# Altium footprint library texas.PCBLIB: 124 footprints (part 8 of 12)
Each footprint in its own frame and in the unit in brackets; x right, y up, seen from the top. Pads: shape width x height; smd on the part's side, far side on the other; paste and mask are expansions set on the pad; w line width, h text height; cw(c..) or ccw(c..) is an arc to the next point about the centre after c.
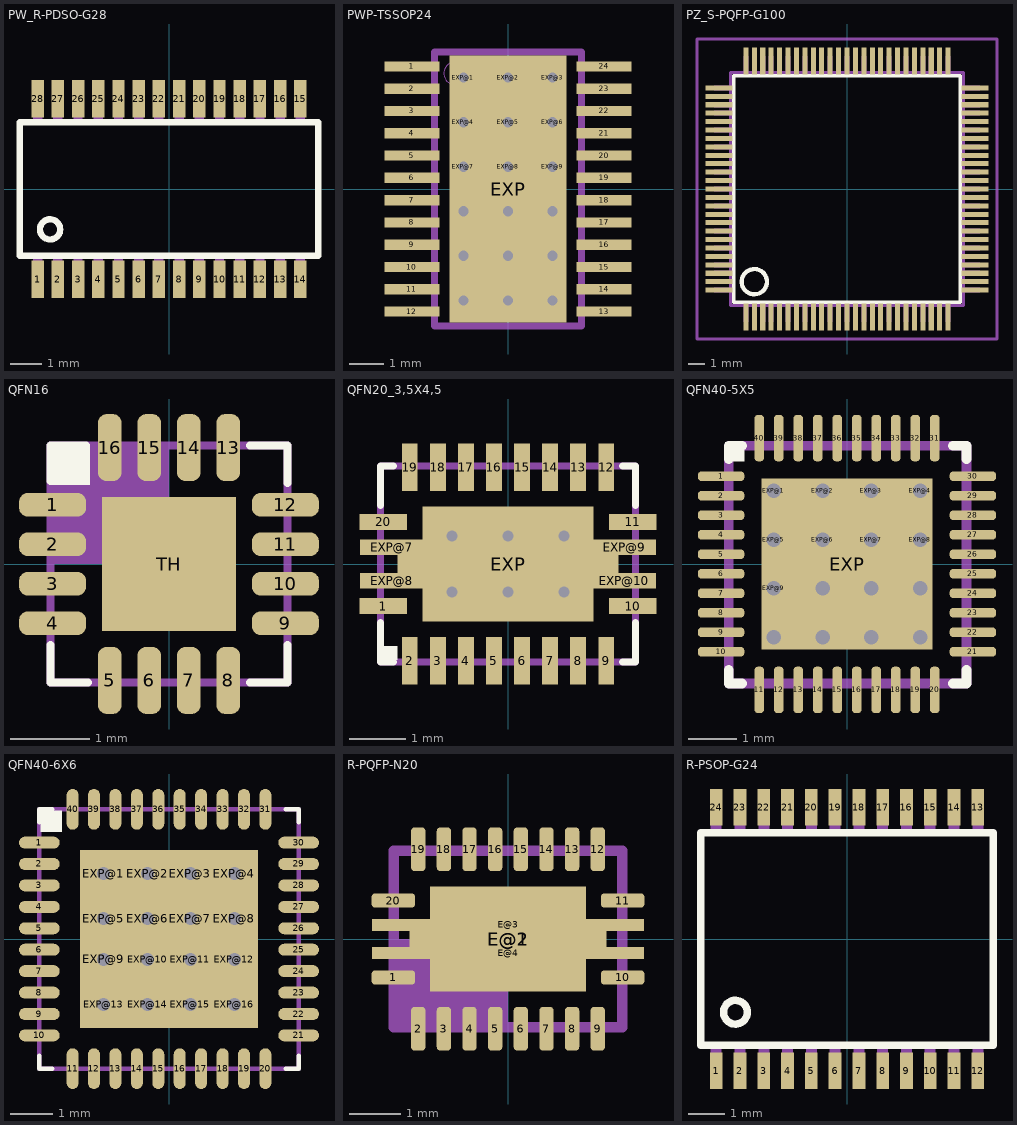
[diagram p7: the footprints below, top view; thin cyan lines are the x and y axes]

## PW_R-PDSO-G28 [mm]
pads (28):
  rect 0.4x1.2 smd: 1(-4.225,-2.9) 2(-3.575,-2.9) 3(-2.925,-2.9) 4(-2.275,-2.9) 5(-1.625,-2.9) 6(-0.975,-2.9) 7(-0.325,-2.9) 8(0.325,-2.9) 9(0.975,-2.9) 10(1.625,-2.9) 11(2.275,-2.9) 12(2.925,-2.9) 13(3.575,-2.9) 14(4.225,-2.9) 15(4.225,2.9) 16(3.575,2.9) 17(2.925,2.9) 18(2.275,2.9) 19(1.625,2.9) 20(0.975,2.9) 21(0.325,2.9) 22(-0.325,2.9) 23(-0.975,2.9) 24(-1.625,2.9) 25(-2.275,2.9) 26(-2.925,2.9) 27(-3.575,2.9) 28(-4.225,2.9)
Top Overlay:
  circle w0.203: c-3.825,-1.3 r0.325
  lines w0.203: -4.8,-2.15 4.8,-2.15 4.8,2.15 -4.8,2.15 -4.8,-2.15
Mechanical 16:
  rectangle: -4.375,-3.3 -4.075,-2.23
  rectangle: -3.725,-3.3 -3.425,-2.23
  rectangle: -3.075,-3.3 -2.775,-2.23
  rectangle: -2.425,-3.3 -2.125,-2.23
  rectangle: -1.775,-3.3 -1.475,-2.23
  rectangle: -1.125,-3.3 -0.825,-2.23
  rectangle: -0.475,-3.3 -0.175,-2.23
  rectangle: 0.175,-3.3 0.475,-2.23
  rectangle: 0.825,-3.3 1.125,-2.23
  rectangle: 1.475,-3.3 1.775,-2.23
  rectangle: 2.125,-3.3 2.425,-2.23
  rectangle: 2.775,-3.3 3.075,-2.23
  rectangle: 3.425,-3.3 3.725,-2.23
  rectangle: 4.075,-3.3 4.375,-2.23
  region: 4.375,3.3 4.075,3.3 4.075,2.23 4.375,2.23
  region: 3.725,3.3 3.425,3.3 3.425,2.23 3.725,2.23
  region: 3.075,3.3 2.775,3.3 2.775,2.23 3.075,2.23
  region: 2.425,3.3 2.125,3.3 2.125,2.23 2.425,2.23
  region: 1.775,3.3 1.475,3.3 1.475,2.23 1.775,2.23
  region: 1.125,3.3 0.825,3.3 0.825,2.23 1.125,2.23
  region: 0.475,3.3 0.175,3.3 0.175,2.23 0.475,2.23
  region: -0.175,3.3 -0.475,3.3 -0.475,2.23 -0.175,2.23
  region: -0.825,3.3 -1.125,3.3 -1.125,2.23 -0.825,2.23
  region: -1.475,3.3 -1.775,3.3 -1.775,2.23 -1.475,2.23
  region: -2.125,3.3 -2.425,3.3 -2.425,2.23 -2.125,2.23
  region: -2.775,3.3 -3.075,3.3 -3.075,2.23 -2.775,2.23
  region: -3.425,3.3 -3.725,3.3 -3.725,2.23 -3.425,2.23
  region: -4.075,3.3 -4.375,3.3 -4.375,2.23 -4.075,2.23

## PWP-TSSOP24 [mm]
pads (43):
  rect 1.6x0.3 smd: 1(-2.8,3.575) 2(-2.8,2.925) 3(-2.8,2.275) 4(-2.8,1.625) 5(-2.8,0.975) 6(-2.8,0.325) 7(-2.8,-0.325) 8(-2.8,-0.975) 9(-2.8,-1.625) 10(-2.8,-2.275) 11(-2.8,-2.925) 12(-2.8,-3.575) 13(2.8,-3.575) 14(2.8,-2.925) 15(2.8,-2.275) 16(2.8,-1.625) 17(2.8,-0.975) 18(2.8,-0.325) 19(2.8,0.325) 20(2.8,0.975) 21(2.8,1.625) 22(2.8,2.275) 23(2.8,2.925) 24(2.8,3.575)
  rect 3.4x7.8 smd: EXP(0,0)
  round 0.7 hole 0.3: EXP@1(-1.3,3.25) EXP@2(0,3.25) EXP@3(1.3,3.25) EXP@4(-1.3,1.95) EXP@5(0,1.95) EXP@6(1.3,1.95) EXP@7(-1.3,0.65) EXP@8(0,0.65) EXP@9(1.3,0.65) EXP@10(-1.3,-0.65) EXP@11(0,-0.65) EXP@12(1.3,-0.65) EXP@13(-1.3,-1.95) EXP@14(0,-1.95) EXP@15(1.3,-1.95) EXP@16(-1.3,-3.25) EXP@17(0,-3.25) EXP@18(1.3,-3.25)
Top Paste:
  rectangle: -3.575,3.45 -2.025,3.7
  rectangle: -3.575,2.8 -2.025,3.05
  rectangle: -3.575,2.15 -2.025,2.4
  rectangle: -3.575,1.5 -2.025,1.75
  rectangle: -3.575,0.85 -2.025,1.1
  rectangle: -3.575,0.2 -2.025,0.45
  rectangle: -3.575,-0.45 -2.025,-0.2
  rectangle: -3.575,-1.1 -2.025,-0.85
  rectangle: -3.575,-1.75 -2.025,-1.5
  rectangle: -3.575,-2.4 -2.025,-2.15
  rectangle: -3.575,-3.05 -2.025,-2.8
  rectangle: -3.575,-3.7 -2.025,-3.45
  region: 3.575,-3.45 2.025,-3.45 2.025,-3.7 3.575,-3.7
  region: 3.575,-2.8 2.025,-2.8 2.025,-3.05 3.575,-3.05
  region: 3.575,-2.15 2.025,-2.15 2.025,-2.4 3.575,-2.4
  region: 3.575,-1.5 2.025,-1.5 2.025,-1.75 3.575,-1.75
  region: 3.575,-0.85 2.025,-0.85 2.025,-1.1 3.575,-1.1
  region: 3.575,-0.2 2.025,-0.2 2.025,-0.45 3.575,-0.45
  region: 3.575,0.45 2.025,0.45 2.025,0.2 3.575,0.2
  region: 3.575,1.1 2.025,1.1 2.025,0.85 3.575,0.85
  region: 3.575,1.75 2.025,1.75 2.025,1.5 3.575,1.5
  region: 3.575,2.4 2.025,2.4 2.025,2.15 3.575,2.15
  region: 3.575,3.05 2.025,3.05 2.025,2.8 3.575,2.8
  region: 3.575,3.7 2.025,3.7 2.025,3.45 3.575,3.45
  rectangle: -1.2,-2.575 1.2,2.575
Top Solder:
  rectangle: -3.65,3.375 -1.95,3.775
  rectangle: -3.65,2.725 -1.95,3.125
  rectangle: -3.65,2.075 -1.95,2.475
  rectangle: -3.65,1.425 -1.95,1.825
  rectangle: -3.65,0.775 -1.95,1.175
  rectangle: -3.65,0.125 -1.95,0.525
  rectangle: -3.65,-0.525 -1.95,-0.125
  rectangle: -3.65,-1.175 -1.95,-0.775
  rectangle: -3.65,-1.825 -1.95,-1.425
  rectangle: -3.65,-2.475 -1.95,-2.075
  rectangle: -3.65,-3.125 -1.95,-2.725
  rectangle: -3.65,-3.775 -1.95,-3.375
  region: 3.65,-3.375 1.95,-3.375 1.95,-3.775 3.65,-3.775
  region: 3.65,-2.725 1.95,-2.725 1.95,-3.125 3.65,-3.125
  region: 3.65,-2.075 1.95,-2.075 1.95,-2.475 3.65,-2.475
  region: 3.65,-1.425 1.95,-1.425 1.95,-1.825 3.65,-1.825
  region: 3.65,-0.775 1.95,-0.775 1.95,-1.175 3.65,-1.175
  region: 3.65,-0.125 1.95,-0.125 1.95,-0.525 3.65,-0.525
  region: 3.65,0.525 1.95,0.525 1.95,0.125 3.65,0.125
  region: 3.65,1.175 1.95,1.175 1.95,0.775 3.65,0.775
  region: 3.65,1.825 1.95,1.825 1.95,1.425 3.65,1.425
  region: 3.65,2.475 1.95,2.475 1.95,2.075 3.65,2.075
  region: 3.65,3.125 1.95,3.125 1.95,2.725 3.65,2.725
  region: 3.65,3.775 1.95,3.775 1.95,3.375 3.65,3.375
  rectangle: -1.7,-3.9 1.7,3.9
Mechanical 16:
  circle w0: c-1.55,3.375 r0.325
  rectangle: -3.2,3.45 -2.2,3.7
  rectangle: -3.2,2.8 -2.2,3.05
  rectangle: -3.2,2.15 -2.2,2.4
  rectangle: -3.2,1.5 -2.2,1.75
  rectangle: -3.2,0.85 -2.2,1.1
  rectangle: -3.2,0.2 -2.2,0.45
  rectangle: -3.2,-0.45 -2.2,-0.2
  rectangle: -3.2,-1.1 -2.2,-0.85
  rectangle: -3.2,-1.75 -2.2,-1.5
  rectangle: -3.2,-2.4 -2.2,-2.15
  rectangle: -3.2,-3.05 -2.2,-2.8
  rectangle: -3.2,-3.7 -2.2,-3.45
  region: 3.2,-3.45 2.2,-3.45 2.2,-3.7 3.2,-3.7
  region: 3.2,-2.8 2.2,-2.8 2.2,-3.05 3.2,-3.05
  region: 3.2,-2.15 2.2,-2.15 2.2,-2.4 3.2,-2.4
  region: 3.2,-1.5 2.2,-1.5 2.2,-1.75 3.2,-1.75
  region: 3.2,-0.85 2.2,-0.85 2.2,-1.1 3.2,-1.1
  region: 3.2,-0.2 2.2,-0.2 2.2,-0.45 3.2,-0.45
  region: 3.2,0.45 2.2,0.45 2.2,0.2 3.2,0.2
  region: 3.2,1.1 2.2,1.1 2.2,0.85 3.2,0.85
  region: 3.2,1.75 2.2,1.75 2.2,1.5 3.2,1.5
  region: 3.2,2.4 2.2,2.4 2.2,2.15 3.2,2.15
  region: 3.2,3.05 2.2,3.05 2.2,2.8 3.2,2.8
  region: 3.2,3.7 2.2,3.7 2.2,3.45 3.2,3.45
  lines w0.203: -2.15,-4 2.15,-4 2.15,4 -2.15,4 -2.15,-4

## PZ_S-PQFP-G100 [mm]
pads (100):
  rect 0.3x1.6 smd: 1(-6,-7.6) 2(-5.5,-7.6) 3(-5,-7.6) 4(-4.5,-7.6) 5(-4,-7.6) 6(-3.5,-7.6) 7(-3,-7.6) 8(-2.5,-7.6) 9(-2,-7.6) 10(-1.5,-7.6) 11(-1,-7.6) 12(-0.5,-7.6) 13(0,-7.6) 14(0.5,-7.6) 15(1,-7.6) 16(1.5,-7.6) 17(2,-7.6) 18(2.5,-7.6) 19(3,-7.6) 20(3.5,-7.6) 21(4,-7.6) 22(4.5,-7.6) 23(5,-7.6) 24(5.5,-7.6) 25(6,-7.6) 51(6,7.6) 52(5.5,7.6) 53(5,7.6) 54(4.5,7.6) 55(4,7.6) 56(3.5,7.6) 57(3,7.6) 58(2.5,7.6) 59(2,7.6) 60(1.5,7.6) 61(1,7.6) 62(0.5,7.6) 63(0,7.6) 64(-0.5,7.6) 65(-1,7.6) 66(-1.5,7.6) 67(-2,7.6) 68(-2.5,7.6) 69(-3,7.6) 70(-3.5,7.6) 71(-4,7.6) 72(-4.5,7.6) 73(-5,7.6) 74(-5.5,7.6) 75(-6,7.6)
  rect 1.6x0.3 smd: 26(7.6,-6) 27(7.6,-5.5) 28(7.6,-5) 29(7.6,-4.5) 30(7.6,-4) 31(7.6,-3.5) 32(7.6,-3) 33(7.6,-2.5) 34(7.6,-2) 35(7.6,-1.5) 36(7.6,-1) 37(7.6,-0.5) 38(7.6,0) 39(7.6,0.5) 40(7.6,1) 41(7.6,1.5) 42(7.6,2) 43(7.6,2.5) 44(7.6,3) 45(7.6,3.5) 46(7.6,4) 47(7.6,4.5) 48(7.6,5) 49(7.6,5.5) 50(7.6,6) 76(-7.6,6) 77(-7.6,5.5) 78(-7.6,5) 79(-7.6,4.5) 80(-7.6,4) 81(-7.6,3.5) 82(-7.6,3) 83(-7.6,2.5) 84(-7.6,2) 85(-7.6,1.5) 86(-7.6,1) 87(-7.6,0.5) 88(-7.6,0) 89(-7.6,-0.5) 90(-7.6,-1) 91(-7.6,-1.5) 92(-7.6,-2) 93(-7.6,-2.5) 94(-7.6,-3) 95(-7.6,-3.5) 96(-7.6,-4) 97(-7.6,-4.5) 98(-7.6,-5) 99(-7.6,-5.5) 100(-7.6,-6)
Top Overlay:
  circle w0.254: c-5.5,-5.5 r0.75
  lines w0.203: -6.72,-6.71 6.71,-6.71 6.71,6.71 -6.72,6.71 -6.72,-6.71
Mechanical 16:
  rectangle: -6.15,-7.9 -5.85,-6.95
  rectangle: -5.65,-7.9 -5.35,-6.95
  rectangle: -5.15,-7.9 -4.85,-6.95
  rectangle: -4.65,-7.9 -4.35,-6.95
  rectangle: -4.15,-7.9 -3.85,-6.95
  rectangle: -3.65,-7.9 -3.35,-6.95
  rectangle: -3.15,-7.9 -2.85,-6.95
  rectangle: -2.65,-7.9 -2.35,-6.95
  rectangle: -2.15,-7.9 -1.85,-6.95
  rectangle: -1.65,-7.9 -1.35,-6.95
  rectangle: -1.15,-7.9 -0.85,-6.95
  rectangle: -0.65,-7.9 -0.35,-6.95
  rectangle: -0.15,-7.9 0.15,-6.95
  rectangle: 0.35,-7.9 0.65,-6.95
  rectangle: 0.85,-7.9 1.15,-6.95
  rectangle: 1.35,-7.9 1.65,-6.95
  rectangle: 1.85,-7.9 2.15,-6.95
  rectangle: 2.35,-7.9 2.65,-6.95
  rectangle: 2.85,-7.9 3.15,-6.95
  rectangle: 3.35,-7.9 3.65,-6.95
  rectangle: 3.85,-7.9 4.15,-6.95
  rectangle: 4.35,-7.9 4.65,-6.95
  rectangle: 4.85,-7.9 5.15,-6.95
  rectangle: 5.35,-7.9 5.65,-6.95
  rectangle: 5.85,-7.9 6.15,-6.95
  rectangle: 6.95,-6.15 7.9,-5.85
  rectangle: 6.95,-5.65 7.9,-5.35
  rectangle: 6.95,-5.15 7.9,-4.85
  rectangle: 6.95,-4.65 7.9,-4.35
  rectangle: 6.95,-4.15 7.9,-3.85
  rectangle: 6.95,-3.65 7.9,-3.35
  rectangle: 6.95,-3.15 7.9,-2.85
  rectangle: 6.95,-2.65 7.9,-2.35
  rectangle: 6.95,-2.15 7.9,-1.85
  rectangle: 6.95,-1.65 7.9,-1.35
  rectangle: 6.95,-1.15 7.9,-0.85
  rectangle: 6.95,-0.65 7.9,-0.35
  rectangle: 6.95,-0.15 7.9,0.15
  rectangle: 6.95,0.35 7.9,0.65
  rectangle: 6.95,0.85 7.9,1.15
  rectangle: 6.95,1.35 7.9,1.65
  rectangle: 6.95,1.85 7.9,2.15
  rectangle: 6.95,2.35 7.9,2.65
  rectangle: 6.95,2.85 7.9,3.15
  rectangle: 6.95,3.35 7.9,3.65
  rectangle: 6.95,3.85 7.9,4.15
  rectangle: 6.95,4.35 7.9,4.65
  rectangle: 6.95,4.85 7.9,5.15
  rectangle: 6.95,5.35 7.9,5.65
  rectangle: 6.95,5.85 7.9,6.15
  rectangle: 5.85,6.95 6.15,7.9
  rectangle: 5.35,6.95 5.65,7.9
  rectangle: 4.85,6.95 5.15,7.9
  rectangle: 4.35,6.95 4.65,7.9
  rectangle: 3.85,6.95 4.15,7.9
  rectangle: 3.35,6.95 3.65,7.9
  rectangle: 2.85,6.95 3.15,7.9
  rectangle: 2.35,6.95 2.65,7.9
  rectangle: 1.85,6.95 2.15,7.9
  rectangle: 1.35,6.95 1.65,7.9
  rectangle: 0.85,6.95 1.15,7.9
  rectangle: 0.35,6.95 0.65,7.9
  rectangle: -0.15,6.95 0.15,7.9
  rectangle: -0.65,6.95 -0.35,7.9
  rectangle: -1.15,6.95 -0.85,7.9
  rectangle: -1.65,6.95 -1.35,7.9
  rectangle: -2.15,6.95 -1.85,7.9
  rectangle: -2.65,6.95 -2.35,7.9
  rectangle: -3.15,6.95 -2.85,7.9
  rectangle: -3.65,6.95 -3.35,7.9
  rectangle: -4.15,6.95 -3.85,7.9
  rectangle: -4.65,6.95 -4.35,7.9
  rectangle: -5.15,6.95 -4.85,7.9
  rectangle: -5.65,6.95 -5.35,7.9
  rectangle: -6.15,6.95 -5.85,7.9
  rectangle: -7.9,5.85 -6.95,6.15
  rectangle: -7.9,5.35 -6.95,5.65
  rectangle: -7.9,4.85 -6.95,5.15
  rectangle: -7.9,4.35 -6.95,4.65
  rectangle: -7.9,3.85 -6.95,4.15
  rectangle: -7.9,3.35 -6.95,3.65
  rectangle: -7.9,2.85 -6.95,3.15
  rectangle: -7.9,2.35 -6.95,2.65
  rectangle: -7.9,1.85 -6.95,2.15
  rectangle: -7.9,1.35 -6.95,1.65
  rectangle: -7.9,0.85 -6.95,1.15
  rectangle: -7.9,0.35 -6.95,0.65
  rectangle: -7.9,-0.15 -6.95,0.15
  rectangle: -7.9,-0.65 -6.95,-0.35
  rectangle: -7.9,-1.15 -6.95,-0.85
  rectangle: -7.9,-1.65 -6.95,-1.35
  rectangle: -7.9,-2.15 -6.95,-1.85
  rectangle: -7.9,-2.65 -6.95,-2.35
  rectangle: -7.9,-3.15 -6.95,-2.85
  rectangle: -7.9,-3.65 -6.95,-3.35
  rectangle: -7.9,-4.15 -6.95,-3.85
  rectangle: -7.9,-4.65 -6.95,-4.35
  rectangle: -7.9,-5.15 -6.95,-4.85
  rectangle: -7.9,-5.65 -6.95,-5.35
  rectangle: -7.9,-6.15 -6.95,-5.85
  lines w0.203: -6.91,-6.91 6.91,-6.91 6.91,6.91 -6.91,6.91 -6.91,-6.91
Mechanical 27:
  lines w0.2: -8.9,-8.9 -8.9,8.9 8.9,8.9 8.9,-8.9 -8.9,-8.9

## QFN16 [mm]
pads (17):
  rrect75% 0.85x0.3 smd: 1(-1.475,0.75) 2(-1.475,0.25) 3(-1.475,-0.25) 4(-1.475,-0.75) 9(1.475,-0.75) 10(1.475,-0.25) 11(1.475,0.25) 12(1.475,0.75)
  rrect75% 0.3x0.85 smd: 5(-0.75,-1.475) 6(-0.25,-1.475) 7(0.25,-1.475) 8(0.75,-1.475) 13(0.75,1.475) 14(0.25,1.475) 15(-0.25,1.475) 16(-0.75,1.475)
  rect 1.7x1.7 smd: TH(0,0)
Top Overlay:
  rectangle: -1.5,1 -1,1.5
  lines w0.102: -1.5,-1.025 -1.5,-1.5 -1.025,-1.5 ; -1.5,1.05 -1.5,1.5 -1.05,1.5 ; 1.025,-1.5 1.5,-1.5 1.5,-1.025 ; 1.025,1.5 1.5,1.5 1.5,1.025
Top Paste:
  circle w0: c-1.2,0.75 r0.125
  circle w0: c-1.2,0.25 r0.125
  circle w0: c-1.2,-0.25 r0.125
  circle w0: c-1.2,-0.75 r0.125
  circle w0: c-0.75,-1.2 r0.125
  circle w0: c-0.25,-1.2 r0.125
  circle w0: c0.25,-1.2 r0.125
  circle w0: c0.75,-1.2 r0.125
  circle w0: c1.2,-0.75 r0.125
  circle w0: c1.2,-0.25 r0.125
  circle w0: c1.2,0.25 r0.125
  circle w0: c1.2,0.75 r0.125
  circle w0: c0.75,1.2 r0.125
  circle w0: c0.25,1.2 r0.125
  circle w0: c-0.25,1.2 r0.125
  circle w0: c-0.75,1.2 r0.125
  region: -0.1,0.1 -0.1,0.8 -0.8,0.8 -0.8,0.1
  rectangle: -1.85,0.625 -1.2,0.875
  rectangle: -1.85,0.125 -1.2,0.375
  rectangle: -1.85,-0.375 -1.2,-0.125
  rectangle: -1.85,-0.875 -1.2,-0.625
  region: -0.625,-1.85 -0.625,-1.2 -0.875,-1.2 -0.875,-1.85
  region: -0.125,-1.85 -0.125,-1.2 -0.375,-1.2 -0.375,-1.85
  region: 0.375,-1.85 0.375,-1.2 0.125,-1.2 0.125,-1.85
  region: 0.875,-1.85 0.875,-1.2 0.625,-1.2 0.625,-1.85
  region: 1.85,-0.625 1.2,-0.625 1.2,-0.875 1.85,-0.875
  region: 1.85,-0.125 1.2,-0.125 1.2,-0.375 1.85,-0.375
  region: 1.85,0.375 1.2,0.375 1.2,0.125 1.85,0.125
  region: 1.85,0.875 1.2,0.875 1.2,0.625 1.85,0.625
  region: 0.625,1.85 0.625,1.2 0.875,1.2 0.875,1.85
  region: 0.125,1.85 0.125,1.2 0.375,1.2 0.375,1.85
  region: -0.375,1.85 -0.375,1.2 -0.125,1.2 -0.125,1.85
  region: -0.875,1.85 -0.875,1.2 -0.625,1.2 -0.625,1.85
  region: -0.1,-0.1 -0.8,-0.1 -0.8,-0.8 -0.1,-0.8
  region: 0.1,-0.1 0.1,-0.8 0.8,-0.8 0.8,-0.1
  rectangle: 0.1,0.1 0.8,0.8
Top Solder:
  circle w0: c-1.2,0.75 r0.2
  circle w0: c-1.2,0.25 r0.2
  circle w0: c-1.2,-0.25 r0.2
  circle w0: c-1.2,-0.75 r0.2
  circle w0: c-0.75,-1.2 r0.2
  circle w0: c-0.25,-1.2 r0.2
  circle w0: c0.25,-1.2 r0.2
  circle w0: c0.75,-1.2 r0.2
  circle w0: c1.2,-0.75 r0.2
  circle w0: c1.2,-0.25 r0.2
  circle w0: c1.2,0.25 r0.2
  circle w0: c1.2,0.75 r0.2
  circle w0: c0.75,1.2 r0.2
  circle w0: c0.25,1.2 r0.2
  circle w0: c-0.25,1.2 r0.2
  circle w0: c-0.75,1.2 r0.2
  rectangle: -0.875,-0.875 0.875,0.875
  rectangle: -1.9,0.55 -1.2,0.95
  rectangle: -1.9,0.05 -1.2,0.45
  rectangle: -1.9,-0.45 -1.2,-0.05
  rectangle: -1.9,-0.95 -1.2,-0.55
  region: -0.55,-1.9 -0.55,-1.2 -0.95,-1.2 -0.95,-1.9
  region: -0.05,-1.9 -0.05,-1.2 -0.45,-1.2 -0.45,-1.9
  region: 0.45,-1.9 0.45,-1.2 0.05,-1.2 0.05,-1.9
  region: 0.95,-1.9 0.95,-1.2 0.55,-1.2 0.55,-1.9
  region: 1.9,-0.55 1.2,-0.55 1.2,-0.95 1.9,-0.95
  region: 1.9,-0.05 1.2,-0.05 1.2,-0.45 1.9,-0.45
  region: 1.9,0.45 1.2,0.45 1.2,0.05 1.9,0.05
  region: 1.9,0.95 1.2,0.95 1.2,0.55 1.9,0.55
  region: 0.55,1.9 0.55,1.2 0.95,1.2 0.95,1.9
  region: 0.05,1.9 0.05,1.2 0.45,1.2 0.45,1.9
  region: -0.45,1.9 -0.45,1.2 -0.05,1.2 -0.05,1.9
  region: -0.95,1.9 -0.95,1.2 -0.55,1.2 -0.55,1.9
Mechanical 14:
  circle w0.01: c0,0 r0.15
  circle w0.01: c0.5,0.5 r0.15
  circle w0.01: c0.5,-0.5 r0.15
  circle w0.01: c-0.5,-0.5 r0.15
  circle w0.01: c-0.5,0.5 r0.15
Mechanical 16:
  rectangle: -1.5,0 0,1.5
  lines w0.102: -1.5,-1.5 1.5,-1.5 1.5,1.5 -1.5,1.5 -1.5,-1.5

## QFN20_3,5X4,5 [mm]
pads (33):
  rect 0.85x0.28 smd: 1(-2.225,-0.75) 10(2.225,-0.75) 11(2.225,0.75) 20(-2.225,0.75)
  rect 0.28x0.85 smd: 2(-1.75,-1.725) 3(-1.25,-1.725) 4(-0.75,-1.725) 5(-0.25,-1.725) 6(0.25,-1.725) 7(0.75,-1.725) 8(1.25,-1.725) 9(1.75,-1.725) 12(1.75,1.725) 13(1.25,1.725) 14(0.75,1.725) 15(0.25,1.725) 16(-0.25,1.725) 17(-0.75,1.725) 18(-1.25,1.725) 19(-1.75,1.725)
  rect 3.05x2.05 smd: EXP(0,0)
  round 0.3 hole 0.2: EXP@1(-1,0.5) EXP@2(0,0.5) EXP@3(1,0.5) EXP@4(-1,-0.5) EXP@5(0,-0.5) EXP@6(1,-0.5)
  rect 1.125x0.28 smd: EXP@7(-2.075,0.3) EXP@8(-2.075,-0.3) EXP@9(2.075,0.3) EXP@10(2.075,-0.3)
  rect 0.45x0.4 smd: EXP@11(-1.75,0) EXP@12(1.75,0)
Top Overlay:
  rectangle: -2.222,-1.714 -1.968,-1.46
  lines w0.127: -2.275,-1.044 -2.275,-1.75 -2.043,-1.75 ; -2.275,1.044 -2.275,1.75 -2.043,1.75 ; 2.043,-1.75 2.275,-1.75 2.275,-1.044 ; 2.043,1.75 2.275,1.75 2.275,1.044
Top Paste:
  circle w0: c-1.75,1.45 r0.115
  circle w0: c-1.25,1.45 r0.115
  circle w0: c-0.75,1.45 r0.115
  circle w0: c-0.25,1.45 r0.115
  circle w0: c0.25,1.45 r0.115
  circle w0: c0.75,1.45 r0.115
  circle w0: c1.25,1.45 r0.115
  circle w0: c1.75,1.45 r0.115
  circle w0: c-1.95,0.75 r0.115
  circle w0: c1.95,0.75 r0.115
  circle w0: c1.95,-0.75 r0.115
  circle w0: c-1.95,-0.75 r0.115
  circle w0: c1.75,-1.45 r0.115
  circle w0: c1.25,-1.45 r0.115
  circle w0: c0.75,-1.45 r0.115
  circle w0: c0.25,-1.45 r0.115
  circle w0: c-0.25,-1.45 r0.115
  circle w0: c-0.75,-1.45 r0.115
  circle w0: c-1.25,-1.45 r0.115
  circle w0: c-1.75,-1.45 r0.115
  rectangle: -1.47,-0.975 -0.15,-0.15
  rectangle: -1.47,0.15 -0.15,0.975
  region: 1.47,-0.15 0.15,-0.15 0.15,-0.975 1.47,-0.975
  region: 1.47,0.975 0.15,0.975 0.15,0.15 1.47,0.15
  rectangle: -1.863,1.45 -1.638,2.125
  rectangle: -1.362,1.45 -1.137,2.125
  rectangle: -0.863,1.45 -0.638,2.125
  rectangle: -0.362,1.45 -0.137,2.125
  rectangle: 0.137,1.45 0.362,2.125
  rectangle: 0.638,1.45 0.863,2.125
  rectangle: 1.137,1.45 1.362,2.125
  rectangle: 1.638,1.45 1.863,2.125
  region: -1.95,0.638 -1.95,0.863 -2.625,0.863 -2.625,0.638
  region: 1.95,0.863 1.95,0.638 2.625,0.638 2.625,0.863
  region: 1.95,-0.638 1.95,-0.863 2.625,-0.863 2.625,-0.638
  region: -1.95,-0.863 -1.95,-0.638 -2.625,-0.638 -2.625,-0.863
  region: 1.863,-1.45 1.638,-1.45 1.638,-2.125 1.863,-2.125
  region: 1.362,-1.45 1.137,-1.45 1.137,-2.125 1.362,-2.125
  region: 0.863,-1.45 0.638,-1.45 0.638,-2.125 0.863,-2.125
  region: 0.362,-1.45 0.137,-1.45 0.137,-2.125 0.362,-2.125
  region: -0.137,-1.45 -0.362,-1.45 -0.362,-2.125 -0.137,-2.125
  region: -0.638,-1.45 -0.863,-1.45 -0.863,-2.125 -0.638,-2.125
  region: -1.137,-1.45 -1.362,-1.45 -1.362,-2.125 -1.137,-2.125
  region: -1.638,-1.45 -1.863,-1.45 -1.863,-2.125 -1.638,-2.125
  region: 2.625,-0.183 1.725,-0.183 1.725,-0.412 2.625,-0.412
  rectangle: -2.625,-0.412 -1.725,-0.183
  rectangle: -2.625,0.183 -1.725,0.412
  region: 2.625,0.412 1.725,0.412 1.725,0.183 2.625,0.183
Top Solder:
  circle w0: c-1.95,0.75 r0.163
  circle w0: c-1.75,1.45 r0.163
  circle w0: c-1.25,1.45 r0.163
  circle w0: c-0.75,1.45 r0.163
  circle w0: c-0.25,1.45 r0.163
  circle w0: c0.25,1.45 r0.163
  circle w0: c0.75,1.45 r0.163
  circle w0: c1.25,1.45 r0.163
  circle w0: c1.75,1.45 r0.163
  circle w0: c1.95,0.75 r0.163
  circle w0: c-1.95,-0.75 r0.163
  circle w0: c1.95,-0.75 r0.163
  circle w0: c1.75,-1.45 r0.163
  circle w0: c1.25,-1.45 r0.163
  circle w0: c0.75,-1.45 r0.163
  circle w0: c0.25,-1.45 r0.163
  circle w0: c-0.25,-1.45 r0.163
  circle w0: c-0.75,-1.45 r0.163
  circle w0: c-1.25,-1.45 r0.163
  circle w0: c-1.75,-1.45 r0.163
  rectangle: -2.675,0.588 -1.95,0.913
  region: 2.662,0.463 1.688,0.463 1.688,0.137 2.662,0.137
  rectangle: -2.662,0.137 -1.688,0.463
  rectangle: -2.662,-0.463 -1.688,-0.137
  region: 2.662,-0.137 1.688,-0.137 1.688,-0.463 2.662,-0.463
  rectangle: -1.55,-1.05 1.55,1.05
  region: -1.913,2.175 -1.913,1.45 -1.587,1.45 -1.587,2.175
  region: -1.412,2.175 -1.412,1.45 -1.087,1.45 -1.087,2.175
  region: -0.913,2.175 -0.913,1.45 -0.588,1.45 -0.588,2.175
  region: -0.412,2.175 -0.412,1.45 -0.087,1.45 -0.087,2.175
  region: 0.087,2.175 0.087,1.45 0.412,1.45 0.412,2.175
  region: 0.588,2.175 0.588,1.45 0.913,1.45 0.913,2.175
  region: 1.087,2.175 1.087,1.45 1.412,1.45 1.412,2.175
  region: 1.587,2.175 1.587,1.45 1.913,1.45 1.913,2.175
  region: 2.675,0.913 1.95,0.913 1.95,0.588 2.675,0.588
  rectangle: -2.675,-0.913 -1.95,-0.588
  region: 2.675,-0.588 1.95,-0.588 1.95,-0.913 2.675,-0.913
  region: 1.913,-2.175 1.913,-1.45 1.587,-1.45 1.587,-2.175
  region: 1.412,-2.175 1.412,-1.45 1.087,-1.45 1.087,-2.175
  region: 0.913,-2.175 0.913,-1.45 0.588,-1.45 0.588,-2.175
  region: 0.412,-2.175 0.412,-1.45 0.087,-1.45 0.087,-2.175
  region: -0.087,-2.175 -0.087,-1.45 -0.412,-1.45 -0.412,-2.175
  region: -0.588,-2.175 -0.588,-1.45 -0.913,-1.45 -0.913,-2.175
  region: -1.087,-2.175 -1.087,-1.45 -1.412,-1.45 -1.412,-2.175
  region: -1.587,-2.175 -1.587,-1.45 -1.913,-1.45 -1.913,-2.175
Mechanical 16:
  lines w0.127: -2.275,-1.75 2.275,-1.75 2.275,1.75 -2.275,1.75 -2.275,-1.75

## QFN40-5X5 [mm]
pads (57):
  rrect75% 0.95x0.2 smd: 1(-2.58,1.8) 2(-2.58,1.4) 3(-2.58,1) 4(-2.58,0.6) 5(-2.58,0.2) 6(-2.58,-0.2) 7(-2.58,-0.6) 8(-2.58,-1) 9(-2.58,-1.4) 10(-2.58,-1.8) 21(2.58,-1.8) 22(2.58,-1.4) 23(2.58,-1) 24(2.58,-0.6) 25(2.58,-0.2) 26(2.58,0.2) 27(2.58,0.6) 28(2.58,1) 29(2.58,1.4) 30(2.58,1.8)
  rrect75% 0.2x0.95 smd: 11(-1.8,-2.58) 12(-1.4,-2.58) 13(-1,-2.58) 14(-0.6,-2.58) 15(-0.2,-2.58) 16(0.2,-2.58) 17(0.6,-2.58) 18(1,-2.58) 19(1.4,-2.58) 20(1.8,-2.58) 31(1.8,2.58) 32(1.4,2.58) 33(1,2.58) 34(0.6,2.58) 35(0.2,2.58) 36(-0.2,2.58) 37(-0.6,2.58) 38(-1,2.58) 39(-1.4,2.58) 40(-1.8,2.58)
  rect 3.5x3.5 smd: EXP(0,0)
  round 0.5 hole 0.3: EXP@1(-1.5,1.5) EXP@2(-0.5,1.5) EXP@3(0.5,1.5) EXP@4(1.5,1.5) EXP@5(-1.5,0.5) EXP@6(-0.5,0.5) EXP@7(0.5,0.5) EXP@8(1.5,0.5) EXP@9(-1.5,-0.5) EXP@10(-0.5,-0.5) EXP@11(0.5,-0.5) EXP@12(1.5,-0.5) EXP@13(-1.5,-1.5) EXP@14(-0.5,-1.5) EXP@15(0.5,-1.5) EXP@16(1.5,-1.5)
Top Overlay:
  rectangle: -2.5,2.1 -2.1,2.5
  lines w0.203: -2.425,-2.175 -2.425,-2.45 -2.15,-2.45 ; -2.425,2.15 -2.425,2.425 -2.15,2.425 ; 2.175,-2.45 2.45,-2.45 2.45,-2.175 ; 2.175,2.425 2.45,2.425 2.45,2.15
Top Paste:
  rectangle: -3,1.725 -2.175,1.875
  rectangle: -3,1.325 -2.175,1.475
  rectangle: -3,0.925 -2.175,1.075
  rectangle: -3,0.525 -2.175,0.675
  rectangle: -3,0.125 -2.175,0.275
  rectangle: -3,-0.275 -2.175,-0.125
  rectangle: -3,-0.675 -2.175,-0.525
  rectangle: -3,-1.075 -2.175,-0.925
  rectangle: -3,-1.475 -2.175,-1.325
  rectangle: -3,-1.875 -2.175,-1.725
  region: -1.725,-3 -1.725,-2.175 -1.875,-2.175 -1.875,-3
  region: -1.325,-3 -1.325,-2.175 -1.475,-2.175 -1.475,-3
  region: -0.925,-3 -0.925,-2.175 -1.075,-2.175 -1.075,-3
  region: -0.525,-3 -0.525,-2.175 -0.675,-2.175 -0.675,-3
  region: -0.125,-3 -0.125,-2.175 -0.275,-2.175 -0.275,-3
  region: 0.275,-3 0.275,-2.175 0.125,-2.175 0.125,-3
  region: 0.675,-3 0.675,-2.175 0.525,-2.175 0.525,-3
  region: 1.075,-3 1.075,-2.175 0.925,-2.175 0.925,-3
  region: 1.475,-3 1.475,-2.175 1.325,-2.175 1.325,-3
  region: 1.875,-3 1.875,-2.175 1.725,-2.175 1.725,-3
  region: 3,-1.725 2.175,-1.725 2.175,-1.875 3,-1.875
  region: 3,-1.325 2.175,-1.325 2.175,-1.475 3,-1.475
  region: 3,-0.925 2.175,-0.925 2.175,-1.075 3,-1.075
  region: 3,-0.525 2.175,-0.525 2.175,-0.675 3,-0.675
  region: 3,-0.125 2.175,-0.125 2.175,-0.275 3,-0.275
  region: 3,0.275 2.175,0.275 2.175,0.125 3,0.125
  region: 3,0.675 2.175,0.675 2.175,0.525 3,0.525
  region: 3,1.075 2.175,1.075 2.175,0.925 3,0.925
  region: 3,1.475 2.175,1.475 2.175,1.325 3,1.325
  region: 3,1.875 2.175,1.875 2.175,1.725 3,1.725
  region: 1.725,3 1.725,2.175 1.875,2.175 1.875,3
  region: 1.325,3 1.325,2.175 1.475,2.175 1.475,3
  region: 0.925,3 0.925,2.175 1.075,2.175 1.075,3
  region: 0.525,3 0.525,2.175 0.675,2.175 0.675,3
  region: 0.125,3 0.125,2.175 0.275,2.175 0.275,3
  region: -0.275,3 -0.275,2.175 -0.125,2.175 -0.125,3
  region: -0.675,3 -0.675,2.175 -0.525,2.175 -0.525,3
  region: -1.075,3 -1.075,2.175 -0.925,2.175 -0.925,3
  region: -1.475,3 -1.475,2.175 -1.325,2.175 -1.325,3
  region: -1.875,3 -1.875,2.175 -1.725,2.175 -1.725,3
  rectangle: -1.65,0.15 -0.15,1.65
  rectangle: 0.15,0.15 1.65,1.65
  rectangle: -1.65,-1.65 -0.15,-0.15
  rectangle: 0.15,-1.65 1.65,-0.15
Top Solder:
  rectangle: -3.075,1.675 -2.075,1.925
  rectangle: -3.075,1.275 -2.075,1.525
  rectangle: -3.075,0.875 -2.075,1.125
  rectangle: -3.075,0.475 -2.075,0.725
  rectangle: -3.075,0.075 -2.075,0.325
  rectangle: -3.075,-0.325 -2.075,-0.075
  rectangle: -3.075,-0.725 -2.075,-0.475
  rectangle: -3.075,-1.125 -2.075,-0.875
  rectangle: -3.075,-1.525 -2.075,-1.275
  rectangle: -3.075,-1.925 -2.075,-1.675
  region: -1.675,-3.075 -1.675,-2.075 -1.925,-2.075 -1.925,-3.075
  region: -1.275,-3.075 -1.275,-2.075 -1.525,-2.075 -1.525,-3.075
  region: -0.875,-3.075 -0.875,-2.075 -1.125,-2.075 -1.125,-3.075
  region: -0.475,-3.075 -0.475,-2.075 -0.725,-2.075 -0.725,-3.075
  region: -0.075,-3.075 -0.075,-2.075 -0.325,-2.075 -0.325,-3.075
  region: 0.325,-3.075 0.325,-2.075 0.075,-2.075 0.075,-3.075
  region: 0.725,-3.075 0.725,-2.075 0.475,-2.075 0.475,-3.075
  region: 1.125,-3.075 1.125,-2.075 0.875,-2.075 0.875,-3.075
  region: 1.525,-3.075 1.525,-2.075 1.275,-2.075 1.275,-3.075
  region: 1.925,-3.075 1.925,-2.075 1.675,-2.075 1.675,-3.075
  region: 3.075,-1.675 2.075,-1.675 2.075,-1.925 3.075,-1.925
  region: 3.075,-1.275 2.075,-1.275 2.075,-1.525 3.075,-1.525
  region: 3.075,-0.875 2.075,-0.875 2.075,-1.125 3.075,-1.125
  region: 3.075,-0.475 2.075,-0.475 2.075,-0.725 3.075,-0.725
  region: 3.075,-0.075 2.075,-0.075 2.075,-0.325 3.075,-0.325
  region: 3.075,0.325 2.075,0.325 2.075,0.075 3.075,0.075
  region: 3.075,0.725 2.075,0.725 2.075,0.475 3.075,0.475
  region: 3.075,1.125 2.075,1.125 2.075,0.875 3.075,0.875
  region: 3.075,1.525 2.075,1.525 2.075,1.275 3.075,1.275
  region: 3.075,1.925 2.075,1.925 2.075,1.675 3.075,1.675
  region: 1.675,3.075 1.675,2.075 1.925,2.075 1.925,3.075
  region: 1.275,3.075 1.275,2.075 1.525,2.075 1.525,3.075
  region: 0.875,3.075 0.875,2.075 1.125,2.075 1.125,3.075
  region: 0.475,3.075 0.475,2.075 0.725,2.075 0.725,3.075
  region: 0.075,3.075 0.075,2.075 0.325,2.075 0.325,3.075
  region: -0.325,3.075 -0.325,2.075 -0.075,2.075 -0.075,3.075
  region: -0.725,3.075 -0.725,2.075 -0.475,2.075 -0.475,3.075
  region: -1.125,3.075 -1.125,2.075 -0.875,2.075 -0.875,3.075
  region: -1.525,3.075 -1.525,2.075 -1.275,2.075 -1.275,3.075
  region: -1.925,3.075 -1.925,2.075 -1.675,2.075 -1.675,3.075
  rectangle: -1.8,-1.8 1.8,1.8
Mechanical 16:
  lines w0.203: -2.425,-2.45 2.45,-2.45 2.45,2.425 -2.425,2.425 -2.425,-2.45

## QFN40-6X6 [mm]
pads (56):
  rrect100% 0.95x0.28 smd: 1(-3.025,2.25) 2(-3.025,1.75) 3(-3.025,1.25) 4(-3.025,0.75) 5(-3.025,0.25) 6(-3.025,-0.25) 7(-3.025,-0.75) 8(-3.025,-1.25) 9(-3.025,-1.75) 10(-3.025,-2.25) 21(3.025,-2.25) 22(3.025,-1.75) 23(3.025,-1.25) 24(3.025,-0.75) 25(3.025,-0.25) 26(3.025,0.25) 27(3.025,0.75) 28(3.025,1.25) 29(3.025,1.75) 30(3.025,2.25)
  rrect100% 0.28x0.95 smd: 11(-2.25,-3.025) 12(-1.75,-3.025) 13(-1.25,-3.025) 14(-0.75,-3.025) 15(-0.25,-3.025) 16(0.25,-3.025) 17(0.75,-3.025) 18(1.25,-3.025) 19(1.75,-3.025) 20(2.25,-3.025) 31(2.25,3.025) 32(1.75,3.025) 33(1.25,3.025) 34(0.75,3.025) 35(0.25,3.025) 36(-0.25,3.025) 37(-0.75,3.025) 38(-1.25,3.025) 39(-1.75,3.025) 40(-2.25,3.025)
  rect 1.1x1.1 hole 0.3: EXP@1(-1.525,1.525) EXP@2(-0.5,1.525) EXP@3(0.5,1.525) EXP@4(1.525,1.525) EXP@5(-1.525,0.475) EXP@6(-0.5,0.475) EXP@7(0.5,0.475) EXP@8(1.525,0.475) EXP@9(-1.525,-0.475) EXP@10(-0.5,-0.475) EXP@11(0.5,-0.475) EXP@12(1.525,-0.475) EXP@13(-1.525,-1.525) EXP@14(-0.5,-1.525) EXP@15(0.5,-1.525) EXP@16(1.525,-1.525)
Top Layer:
  rectangle: -3,2.75 -2.75,3
Top Overlay:
  rectangle: -3,2.5 -2.5,3
  lines w0.102: -3.025,-2.725 -3.025,-3.025 -2.725,-3.025 ; -3.025,2.725 -3.025,3.025 -2.725,3.025 ; 2.725,-3.025 3.025,-3.025 3.025,-2.725 ; 2.725,3.025 3.025,3.025 3.025,2.725
Top Paste:
  circle w0: c-2.7,2.25 r0.125
  circle w0: c-2.7,1.75 r0.125
  circle w0: c-2.7,1.25 r0.125
  circle w0: c-2.7,0.75 r0.125
  circle w0: c-2.7,0.25 r0.125
  circle w0: c-2.7,-0.25 r0.125
  circle w0: c-2.7,-0.75 r0.125
  circle w0: c-2.7,-1.25 r0.125
  circle w0: c-2.7,-1.75 r0.125
  circle w0: c-2.7,-2.25 r0.125
  circle w0: c-2.25,-2.7 r0.125
  circle w0: c-1.75,-2.7 r0.125
  circle w0: c-1.25,-2.7 r0.125
  circle w0: c-0.75,-2.7 r0.125
  circle w0: c-0.25,-2.7 r0.125
  circle w0: c0.25,-2.7 r0.125
  circle w0: c0.75,-2.7 r0.125
  circle w0: c1.25,-2.7 r0.125
  circle w0: c1.75,-2.7 r0.125
  circle w0: c2.25,-2.7 r0.125
  circle w0: c2.7,-2.25 r0.125
  circle w0: c2.7,-1.75 r0.125
  circle w0: c2.7,-1.25 r0.125
  circle w0: c2.7,-0.75 r0.125
  circle w0: c2.7,-0.25 r0.125
  circle w0: c2.7,0.25 r0.125
  circle w0: c2.7,0.75 r0.125
  circle w0: c2.7,1.25 r0.125
  circle w0: c2.7,1.75 r0.125
  circle w0: c2.7,2.25 r0.125
  circle w0: c2.25,2.7 r0.125
  circle w0: c1.75,2.7 r0.125
  circle w0: c1.25,2.7 r0.125
  circle w0: c0.75,2.7 r0.125
  circle w0: c0.25,2.7 r0.125
  circle w0: c-0.25,2.7 r0.125
  circle w0: c-0.75,2.7 r0.125
  circle w0: c-1.25,2.7 r0.125
  circle w0: c-1.75,2.7 r0.125
  circle w0: c-2.25,2.7 r0.125
  rectangle: -3.375,2.125 -2.7,2.375
  rectangle: -3.375,1.625 -2.7,1.875
  rectangle: -3.375,1.125 -2.7,1.375
  rectangle: -3.375,0.625 -2.7,0.875
  rectangle: -3.375,0.125 -2.7,0.375
  rectangle: -3.375,-0.375 -2.7,-0.125
  rectangle: -3.375,-0.875 -2.7,-0.625
  rectangle: -3.375,-1.375 -2.7,-1.125
  rectangle: -3.375,-1.875 -2.7,-1.625
  rectangle: -3.375,-2.375 -2.7,-2.125
  region: -2.125,-3.375 -2.125,-2.7 -2.375,-2.7 -2.375,-3.375
  region: -1.625,-3.375 -1.625,-2.7 -1.875,-2.7 -1.875,-3.375
  region: -1.125,-3.375 -1.125,-2.7 -1.375,-2.7 -1.375,-3.375
  region: -0.625,-3.375 -0.625,-2.7 -0.875,-2.7 -0.875,-3.375
  region: -0.125,-3.375 -0.125,-2.7 -0.375,-2.7 -0.375,-3.375
  region: 0.375,-3.375 0.375,-2.7 0.125,-2.7 0.125,-3.375
  region: 0.875,-3.375 0.875,-2.7 0.625,-2.7 0.625,-3.375
  region: 1.375,-3.375 1.375,-2.7 1.125,-2.7 1.125,-3.375
  region: 1.875,-3.375 1.875,-2.7 1.625,-2.7 1.625,-3.375
  region: 2.375,-3.375 2.375,-2.7 2.125,-2.7 2.125,-3.375
  region: 3.375,-2.125 2.7,-2.125 2.7,-2.375 3.375,-2.375
  region: 3.375,-1.625 2.7,-1.625 2.7,-1.875 3.375,-1.875
  region: 3.375,-1.125 2.7,-1.125 2.7,-1.375 3.375,-1.375
  region: 3.375,-0.625 2.7,-0.625 2.7,-0.875 3.375,-0.875
  region: 3.375,-0.125 2.7,-0.125 2.7,-0.375 3.375,-0.375
  region: 3.375,0.375 2.7,0.375 2.7,0.125 3.375,0.125
  region: 3.375,0.875 2.7,0.875 2.7,0.625 3.375,0.625
  region: 3.375,1.375 2.7,1.375 2.7,1.125 3.375,1.125
  region: 3.375,1.875 2.7,1.875 2.7,1.625 3.375,1.625
  region: 3.375,2.375 2.7,2.375 2.7,2.125 3.375,2.125
  region: 2.125,3.375 2.125,2.7 2.375,2.7 2.375,3.375
  region: 1.625,3.375 1.625,2.7 1.875,2.7 1.875,3.375
  region: 1.125,3.375 1.125,2.7 1.375,2.7 1.375,3.375
  region: 0.625,3.375 0.625,2.7 0.875,2.7 0.875,3.375
  region: 0.125,3.375 0.125,2.7 0.375,2.7 0.375,3.375
  region: -0.375,3.375 -0.375,2.7 -0.125,2.7 -0.125,3.375
  region: -0.875,3.375 -0.875,2.7 -0.625,2.7 -0.625,3.375
  region: -1.375,3.375 -1.375,2.7 -1.125,2.7 -1.125,3.375
  region: -1.875,3.375 -1.875,2.7 -1.625,2.7 -1.625,3.375
  region: -2.375,3.375 -2.375,2.7 -2.125,2.7 -2.125,3.375
  rectangle: -1.975,0.925 -0.925,1.975
  rectangle: -0.525,0.925 0.525,1.975
  rectangle: 0.925,0.925 1.975,1.975
  rectangle: -1.975,-0.525 -0.925,0.525
  rectangle: -0.525,-0.525 0.525,0.525
  rectangle: 0.925,-0.525 1.975,0.525
  rectangle: -1.975,-1.975 -0.925,-0.925
  rectangle: -0.525,-1.975 0.525,-0.925
  rectangle: 0.925,-1.975 1.975,-0.925
Top Solder:
  circle w0: c-2.7,2.25 r0.2
  circle w0: c-2.7,1.75 r0.2
  circle w0: c-2.7,1.25 r0.2
  circle w0: c-2.7,0.75 r0.2
  circle w0: c-2.7,0.25 r0.2
  circle w0: c-2.7,-0.25 r0.2
  circle w0: c-2.7,-0.75 r0.2
  circle w0: c-2.7,-1.25 r0.2
  circle w0: c-2.7,-1.75 r0.2
  circle w0: c-2.7,-2.25 r0.2
  circle w0: c-2.25,-2.7 r0.2
  circle w0: c-1.75,-2.7 r0.2
  circle w0: c-1.25,-2.7 r0.2
  circle w0: c-0.75,-2.7 r0.2
  circle w0: c-0.25,-2.7 r0.2
  circle w0: c0.25,-2.7 r0.2
  circle w0: c0.75,-2.7 r0.2
  circle w0: c1.25,-2.7 r0.2
  circle w0: c1.75,-2.7 r0.2
  circle w0: c2.25,-2.7 r0.2
  circle w0: c2.7,-2.25 r0.2
  circle w0: c2.7,-1.75 r0.2
  circle w0: c2.7,-1.25 r0.2
  circle w0: c2.7,-0.75 r0.2
  circle w0: c2.7,-0.25 r0.2
  circle w0: c2.7,0.25 r0.2
  circle w0: c2.7,0.75 r0.2
  circle w0: c2.7,1.25 r0.2
  circle w0: c2.7,1.75 r0.2
  circle w0: c2.7,2.25 r0.2
  circle w0: c2.25,2.7 r0.2
  circle w0: c1.75,2.7 r0.2
  circle w0: c1.25,2.7 r0.2
  circle w0: c0.75,2.7 r0.2
  circle w0: c0.25,2.7 r0.2
  circle w0: c-0.25,2.7 r0.2
  circle w0: c-0.75,2.7 r0.2
  circle w0: c-1.25,2.7 r0.2
  circle w0: c-1.75,2.7 r0.2
  circle w0: c-2.25,2.7 r0.2
  rectangle: -3.4,2.05 -2.7,2.45
  rectangle: -3.4,1.55 -2.7,1.95
  rectangle: -3.4,1.05 -2.7,1.45
  rectangle: -3.4,0.55 -2.7,0.95
  rectangle: -3.4,0.05 -2.7,0.45
  rectangle: -3.4,-0.45 -2.7,-0.05
  rectangle: -3.4,-0.95 -2.7,-0.55
  rectangle: -3.4,-1.45 -2.7,-1.05
  rectangle: -3.4,-1.95 -2.7,-1.55
  rectangle: -3.4,-2.45 -2.7,-2.05
  region: -2.05,-3.4 -2.05,-2.7 -2.45,-2.7 -2.45,-3.4
  region: -1.55,-3.4 -1.55,-2.7 -1.95,-2.7 -1.95,-3.4
  region: -1.05,-3.4 -1.05,-2.7 -1.45,-2.7 -1.45,-3.4
  region: -0.55,-3.4 -0.55,-2.7 -0.95,-2.7 -0.95,-3.4
  region: -0.05,-3.4 -0.05,-2.7 -0.45,-2.7 -0.45,-3.4
  region: 0.45,-3.4 0.45,-2.7 0.05,-2.7 0.05,-3.4
  region: 0.95,-3.4 0.95,-2.7 0.55,-2.7 0.55,-3.4
  region: 1.45,-3.4 1.45,-2.7 1.05,-2.7 1.05,-3.4
  region: 1.95,-3.4 1.95,-2.7 1.55,-2.7 1.55,-3.4
  region: 2.45,-3.4 2.45,-2.7 2.05,-2.7 2.05,-3.4
  region: 3.4,-2.05 2.7,-2.05 2.7,-2.45 3.4,-2.45
  region: 3.4,-1.55 2.7,-1.55 2.7,-1.95 3.4,-1.95
  region: 3.4,-1.05 2.7,-1.05 2.7,-1.45 3.4,-1.45
  region: 3.4,-0.55 2.7,-0.55 2.7,-0.95 3.4,-0.95
  region: 3.4,-0.05 2.7,-0.05 2.7,-0.45 3.4,-0.45
  region: 3.4,0.45 2.7,0.45 2.7,0.05 3.4,0.05
  region: 3.4,0.95 2.7,0.95 2.7,0.55 3.4,0.55
  region: 3.4,1.45 2.7,1.45 2.7,1.05 3.4,1.05
  region: 3.4,1.95 2.7,1.95 2.7,1.55 3.4,1.55
  region: 3.4,2.45 2.7,2.45 2.7,2.05 3.4,2.05
  region: 2.05,3.4 2.05,2.7 2.45,2.7 2.45,3.4
  region: 1.55,3.4 1.55,2.7 1.95,2.7 1.95,3.4
  region: 1.05,3.4 1.05,2.7 1.45,2.7 1.45,3.4
  region: 0.55,3.4 0.55,2.7 0.95,2.7 0.95,3.4
  region: 0.05,3.4 0.05,2.7 0.45,2.7 0.45,3.4
  region: -0.45,3.4 -0.45,2.7 -0.05,2.7 -0.05,3.4
  region: -0.95,3.4 -0.95,2.7 -0.55,2.7 -0.55,3.4
  region: -1.45,3.4 -1.45,2.7 -1.05,2.7 -1.05,3.4
  region: -1.95,3.4 -1.95,2.7 -1.55,2.7 -1.55,3.4
  region: -2.45,3.4 -2.45,2.7 -2.05,2.7 -2.05,3.4
  rectangle: -2.025,0.875 -0.875,2.025
  rectangle: -0.575,0.875 0.575,2.025
  rectangle: 0.875,0.875 2.025,2.025
  rectangle: -2.025,-0.575 -0.875,0.575
  rectangle: -0.575,-0.575 0.575,0.575
  rectangle: 0.875,-0.575 2.025,0.575
  rectangle: -2.025,-2.025 -0.875,-0.875
  rectangle: -0.575,-2.025 0.575,-0.875
  rectangle: 0.875,-2.025 2.025,-0.875
Mechanical 16:
  lines w0.102: -3.025,-3.025 3.025,-3.025 3.025,3.025 -3.025,3.025 -3.025,-3.025

## R-PQFP-N20 [mm]
pads (24):
  rrect50% 0.85x0.28 smd: 1(-2.235,-0.75) 10(2.235,-0.75) 11(2.235,0.75) 20(-2.235,0.75)
  rrect50% 0.28x0.85 smd: 2(-1.75,-1.75) 3(-1.25,-1.75) 4(-0.75,-1.75) 5(-0.25,-1.75) 6(0.25,-1.75) 7(0.75,-1.75) 8(1.25,-1.75) 9(1.75,-1.75) 12(1.75,1.75) 13(1.25,1.75) 14(0.75,1.75) 15(0.25,1.75) 16(-0.25,1.75) 17(-0.75,1.75) 18(-1.25,1.75) 19(-1.75,1.75)
  rect 3.05x2.05 smd: E@1(0,0)
  rect 3.85x0.5 smd: E@2(0,0)
  rect 5.3x0.23 smd: E@3(0,0.275) E@4(0,-0.275)
Top Paste:
  circle w0: c-1.94,-0.75 r0.115
  circle w0: c-1.75,-1.44 r0.115
  circle w0: c-1.25,-1.44 r0.115
  circle w0: c-0.75,-1.44 r0.115
  circle w0: c-0.25,-1.44 r0.115
  circle w0: c0.25,-1.44 r0.115
  circle w0: c0.75,-1.44 r0.115
  circle w0: c1.25,-1.44 r0.115
  circle w0: c1.75,-1.44 r0.115
  circle w0: c1.94,-0.75 r0.115
  circle w0: c1.94,0.75 r0.115
  circle w0: c1.75,1.44 r0.115
  circle w0: c1.25,1.44 r0.115
  circle w0: c0.75,1.44 r0.115
  circle w0: c0.25,1.44 r0.115
  circle w0: c-0.25,1.44 r0.115
  circle w0: c-0.75,1.44 r0.115
  circle w0: c-1.25,1.44 r0.115
  circle w0: c-1.75,1.44 r0.115
  circle w0: c-1.94,0.75 r0.115
  rectangle: -2.625,0.16 -1.725,0.39
  rectangle: -2.625,-0.39 -1.725,-0.16
  rectangle: -2.625,-0.865 -1.94,-0.635
  region: -1.635,-2.125 -1.635,-1.44 -1.865,-1.44 -1.865,-2.125
  region: -1.135,-2.125 -1.135,-1.44 -1.365,-1.44 -1.365,-2.125
  region: -0.635,-2.125 -0.635,-1.44 -0.865,-1.44 -0.865,-2.125
  region: -0.135,-2.125 -0.135,-1.44 -0.365,-1.44 -0.365,-2.125
  region: 0.365,-2.125 0.365,-1.44 0.135,-1.44 0.135,-2.125
  region: 0.865,-2.125 0.865,-1.44 0.635,-1.44 0.635,-2.125
  region: 1.365,-2.125 1.365,-1.44 1.135,-1.44 1.135,-2.125
  region: 1.865,-2.125 1.865,-1.44 1.635,-1.44 1.635,-2.125
  region: 2.625,-0.635 1.94,-0.635 1.94,-0.865 2.625,-0.865
  region: 2.625,0.865 1.94,0.865 1.94,0.635 2.625,0.635
  region: 1.635,2.125 1.635,1.44 1.865,1.44 1.865,2.125
  region: 1.135,2.125 1.135,1.44 1.365,1.44 1.365,2.125
  region: 0.635,2.125 0.635,1.44 0.865,1.44 0.865,2.125
  region: 0.135,2.125 0.135,1.44 0.365,1.44 0.365,2.125
  region: -0.365,2.125 -0.365,1.44 -0.135,1.44 -0.135,2.125
  region: -0.865,2.125 -0.865,1.44 -0.635,1.44 -0.635,2.125
  region: -1.365,2.125 -1.365,1.44 -1.135,1.44 -1.135,2.125
  region: -1.865,2.125 -1.865,1.44 -1.635,1.44 -1.635,2.125
  rectangle: -2.625,0.635 -1.94,0.865
  rectangle: -1.47,0.15 -0.15,0.97
  rectangle: -1.47,-0.97 -0.15,-0.15
  region: 1.47,-0.15 0.15,-0.15 0.15,-0.97 1.47,-0.97
  region: 1.47,0.97 0.15,0.97 0.15,0.15 1.47,0.15
  region: 2.625,-0.16 1.725,-0.16 1.725,-0.39 2.625,-0.39
  region: 2.625,0.39 1.725,0.39 1.725,0.16 2.625,0.16
Top Solder:
  circle w0: c-1.94,-0.75 r0.21
  circle w0: c-1.75,-1.44 r0.21
  circle w0: c-1.25,-1.44 r0.21
  circle w0: c-0.75,-1.44 r0.21
  circle w0: c-0.25,-1.44 r0.21
  circle w0: c0.25,-1.44 r0.21
  circle w0: c0.75,-1.44 r0.21
  circle w0: c1.25,-1.44 r0.21
  circle w0: c1.75,-1.44 r0.21
  circle w0: c1.94,-0.75 r0.21
  circle w0: c1.94,0.75 r0.21
  circle w0: c1.75,1.44 r0.21
  circle w0: c1.25,1.44 r0.21
  circle w0: c0.75,1.44 r0.21
  circle w0: c0.25,1.44 r0.21
  circle w0: c-0.25,1.44 r0.21
  circle w0: c-0.75,1.44 r0.21
  circle w0: c-1.25,1.44 r0.21
  circle w0: c-1.75,1.44 r0.21
  circle w0: c-1.94,0.75 r0.21
  region: -2.74,-0.54 -2.74,-0.96 -1.94,-0.96 -1.94,-0.54
  rectangle: -1.96,-2.24 -1.54,-1.44
  rectangle: -1.46,-2.24 -1.04,-1.44
  rectangle: -0.96,-2.24 -0.54,-1.44
  rectangle: -0.46,-2.24 -0.04,-1.44
  rectangle: 0.04,-2.24 0.46,-1.44
  rectangle: 0.54,-2.24 0.96,-1.44
  rectangle: 1.04,-2.24 1.46,-1.44
  rectangle: 1.54,-2.24 1.96,-1.44
  region: 2.74,-0.96 2.74,-0.54 1.94,-0.54 1.94,-0.96
  region: 2.74,0.54 2.74,0.96 1.94,0.96 1.94,0.54
  region: 1.96,2.24 1.54,2.24 1.54,1.44 1.96,1.44
  region: 1.46,2.24 1.04,2.24 1.04,1.44 1.46,1.44
  region: 0.96,2.24 0.54,2.24 0.54,1.44 0.96,1.44
  region: 0.46,2.24 0.04,2.24 0.04,1.44 0.46,1.44
  region: -0.04,2.24 -0.46,2.24 -0.46,1.44 -0.04,1.44
  region: -0.54,2.24 -0.96,2.24 -0.96,1.44 -0.54,1.44
  region: -1.04,2.24 -1.46,2.24 -1.46,1.44 -1.04,1.44
  region: -1.54,2.24 -1.96,2.24 -1.96,1.44 -1.54,1.44
  region: -2.74,0.96 -2.74,0.54 -1.94,0.54 -1.94,0.96
  rectangle: -2.675,0.15 -1.5,0.4
  rectangle: -2.675,-0.4 -1.5,-0.15
  region: 2.675,-0.15 1.5,-0.15 1.5,-0.4 2.675,-0.4
  region: 2.675,0.4 1.5,0.4 1.5,0.15 2.675,0.15
  rectangle: -1.55,-1.05 1.55,1.05
  rectangle: -1.95,-0.175 -1.5,0.175
  region: 1.95,0.175 1.5,0.175 1.5,-0.175 1.95,-0.175
Mechanical 16:
  rectangle: -2.215,-1.725 0,0
  lines w0.203: -2.225,-1.725 2.225,-1.725 2.225,1.725 -2.225,1.725 -2.225,-1.725

## R-PSOP-G24 [mm]
pads (24):
  rect 0.35x1 smd: 1(-3.575,-3.6) 2(-2.925,-3.6) 3(-2.275,-3.6) 4(-1.625,-3.6) 5(-0.975,-3.6) 6(-0.325,-3.6) 7(0.325,-3.6) 8(0.975,-3.6) 9(1.625,-3.6) 10(2.275,-3.6) 11(2.925,-3.6) 12(3.575,-3.6) 13(3.575,3.6) 14(2.925,3.6) 15(2.275,3.6) 16(1.625,3.6) 17(0.975,3.6) 18(0.325,3.6) 19(-0.325,3.6) 20(-0.975,3.6) 21(-1.625,3.6) 22(-2.275,3.6) 23(-2.925,3.6) 24(-3.575,3.6)
Top Overlay:
  circle w0.203: c-3.05,-2 r0.325
  lines w0.203: -4,-2.9 4,-2.9 4,2.9 -4,2.9 -4,-2.9
Mechanical 16:
  rectangle: -3.725,-3.9 -3.425,-2.975
  rectangle: -3.075,-3.9 -2.775,-2.975
  rectangle: -2.425,-3.9 -2.125,-2.975
  rectangle: -1.775,-3.9 -1.475,-2.975
  rectangle: -1.125,-3.9 -0.825,-2.975
  rectangle: -0.475,-3.9 -0.175,-2.975
  rectangle: 0.175,-3.9 0.475,-2.975
  rectangle: 0.825,-3.9 1.125,-2.975
  rectangle: 1.475,-3.9 1.775,-2.975
  rectangle: 2.125,-3.9 2.425,-2.975
  rectangle: 2.775,-3.9 3.075,-2.975
  rectangle: 3.425,-3.9 3.725,-2.975
  region: 3.725,3.9 3.425,3.9 3.425,2.975 3.725,2.975
  region: 3.075,3.9 2.775,3.9 2.775,2.975 3.075,2.975
  region: 2.425,3.9 2.125,3.9 2.125,2.975 2.425,2.975
  region: 1.775,3.9 1.475,3.9 1.475,2.975 1.775,2.975
  region: 1.125,3.9 0.825,3.9 0.825,2.975 1.125,2.975
  region: 0.475,3.9 0.175,3.9 0.175,2.975 0.475,2.975
  region: -0.175,3.9 -0.475,3.9 -0.475,2.975 -0.175,2.975
  region: -0.825,3.9 -1.125,3.9 -1.125,2.975 -0.825,2.975
  region: -1.475,3.9 -1.775,3.9 -1.775,2.975 -1.475,2.975
  region: -2.125,3.9 -2.425,3.9 -2.425,2.975 -2.125,2.975
  region: -2.775,3.9 -3.075,3.9 -3.075,2.975 -2.775,2.975
  region: -3.425,3.9 -3.725,3.9 -3.725,2.975 -3.425,2.975